# Altium footprint library con-samtec.PCBLIB: 805 footprints (part 27 of 55)
Each footprint in its own frame and in the unit in brackets; x right, y up, seen from the top. Pads: shape width x height; smd on the part's side, far side on the other; paste and mask are expansions set on the pad; w line width, h text height; cw(c..) or ccw(c..) is an arc to the next point about the centre after c.
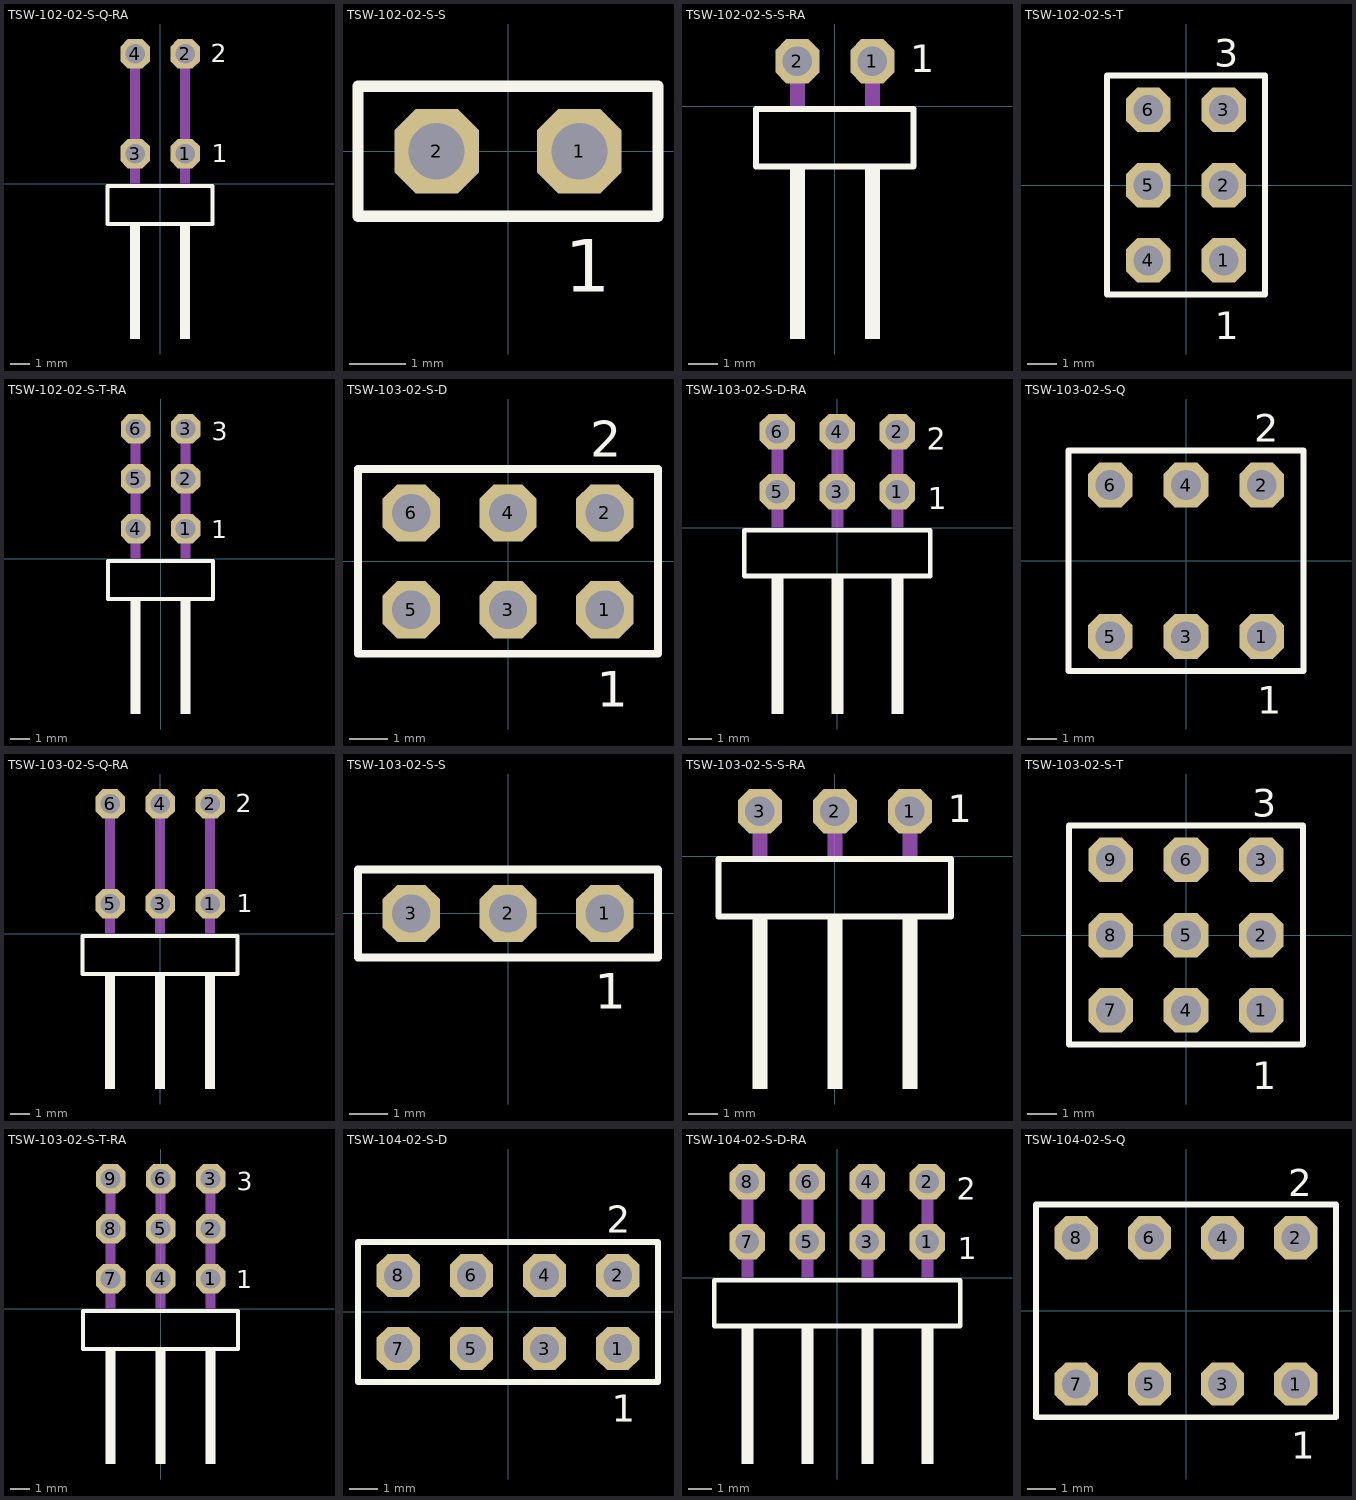
[diagram p26: the footprints below, top view; thin cyan lines are the x and y axes]

## TSW-102-02-S-Q-RA [mil]
pads (4):
  oct 59.06x59.06 hole 39.37: 1(50,60) 2(50,260) 3(-50,60) 4(-50,260)
Top Overlay:
  rectangle: -60,-310.63 -40,-80.32
  rectangle: 40,-310.63 60,-80.32
  lines w8: -105.08,-80.55 105.08,-80.55 105.08,-4.17 -105.08,-4.17 -105.08,-80.55
  text "1" at 103.54,43.31 h36.81
  text "2" at 101.18,242.72 h36.81
Mechanical 16:
  rectangle: -60,0 -40,270
  rectangle: 40,0 60,270

## TSW-102-02-S-S [mm]
pads (2):
  oct 1.5x1.5 hole 1: 1(1.27,0) 2(-1.27,0)
Top Overlay:
  lines w0.203: -2.669,-1.155 2.669,-1.155 2.669,1.155 -2.669,1.155 -2.669,-1.155
  text "1" at 1.012,-2.498 h0.94
Mechanical 16:
  rectangle: -1.62,-0.35 -0.92,0.35
  rectangle: 0.92,-0.35 1.62,0.35

## TSW-102-02-S-S-RA [mil]
pads (2):
  oct 59.06x59.06 hole 39.37: 1(50,60) 2(-50,60)
Top Overlay:
  rectangle: -60,-310.63 -40,-80.32
  rectangle: 40,-310.63 60,-80.32
  lines w8: -105.08,-80.55 105.08,-80.55 105.08,-4.17 -105.08,-4.17 -105.08,-80.55
  text "1" at 100.47,45.35 h36.81
Mechanical 16:
  rectangle: -60,0 -40,70
  rectangle: 40,0 60,70

## TSW-102-02-S-T [mm]
pads (6):
  oct 1.5x1.5 hole 1: 1(1.27,-2.54) 2(1.27,0) 3(1.27,2.54) 4(-1.27,-2.54) 5(-1.27,0) 6(-1.27,2.54)
Top Overlay:
  lines w0.203: -2.669,-3.695 2.669,-3.695 2.669,3.695 -2.669,3.695 -2.669,-3.695
  text "1" at 0.962,-5.188 h0.94
  text "3" at 0.958,3.989 h0.94
Mechanical 16:
  rectangle: -1.62,-2.89 -0.92,-2.19
  rectangle: -1.62,-0.35 -0.92,0.35
  rectangle: -1.62,2.19 -0.92,2.89
  rectangle: 0.92,-2.89 1.62,-2.19
  rectangle: 0.92,-0.35 1.62,0.35
  rectangle: 0.92,2.19 1.62,2.89

## TSW-102-02-S-T-RA [mil]
pads (6):
  oct 59.06x59.06 hole 39.37: 1(50,60) 2(50,160) 3(50,260) 4(-50,60) 5(-50,160) 6(-50,260)
Top Overlay:
  rectangle: -60,-310.63 -40,-80.32
  rectangle: 40,-310.63 60,-80.32
  lines w8: -105.08,-80.55 105.08,-80.55 105.08,-4.17 -105.08,-4.17 -105.08,-80.55
  text "1" at 101.57,41.34 h36.81
  text "3" at 102.17,236.81 h36.81
Mechanical 16:
  rectangle: -60,0 -40,270
  rectangle: 40,0 60,270

## TSW-103-02-S-D [mm]
pads (6):
  oct 1.5x1.5 hole 1: 1(2.54,-1.27) 2(2.54,1.27) 3(0,-1.27) 4(0,1.27) 5(-2.54,-1.27) 6(-2.54,1.27)
Top Overlay:
  lines w0.203: -3.939,-2.425 3.939,-2.425 3.939,2.425 -3.939,2.425 -3.939,-2.425
  text "1" at 2.332,-3.818 h0.94
  text "2" at 2.157,2.744 h0.94
Mechanical 16:
  rectangle: -2.89,-1.62 -2.19,-0.92
  rectangle: -2.89,0.92 -2.19,1.62
  rectangle: -0.35,-1.62 0.35,-0.92
  rectangle: -0.35,0.92 0.35,1.62
  rectangle: 2.19,-1.62 2.89,-0.92
  rectangle: 2.19,0.92 2.89,1.62

## TSW-103-02-S-D-RA [mil]
pads (6):
  oct 59.06x59.06 hole 39.37: 1(100,60) 2(100,160) 3(0,60) 4(0,160) 5(-100,60) 6(-100,160)
Top Overlay:
  rectangle: -110,-310.63 -90,-80.32
  rectangle: -10,-310.63 10,-80.32
  rectangle: 90,-310.63 110,-80.32
  lines w8: -155.08,-80.55 155.08,-80.55 155.08,-4.17 -155.08,-4.17 -155.08,-80.55
  text "1" at 150.59,30.51 h36.81
  text "2" at 149.21,129.53 h36.81
Mechanical 16:
  rectangle: -110,0 -90,170
  rectangle: -10,0 10,170
  rectangle: 90,0 110,170

## TSW-103-02-S-Q [mm]
pads (6):
  oct 1.5x1.5 hole 1: 1(2.54,-2.54) 2(2.54,2.54) 3(0,-2.54) 4(0,2.54) 5(-2.54,-2.54) 6(-2.54,2.54)
Top Overlay:
  lines w0.203: -3.939,-3.695 3.939,-3.695 3.939,3.695 -3.939,3.695 -3.939,-3.695
  text "1" at 2.382,-5.138 h0.94
  text "2" at 2.282,3.989 h0.94
Mechanical 16:
  rectangle: -2.89,-2.89 -2.19,-2.19
  rectangle: -2.89,2.19 -2.19,2.89
  rectangle: -0.35,-2.89 0.35,-2.19
  rectangle: -0.35,2.19 0.35,2.89
  rectangle: 2.19,-2.89 2.89,-2.19
  rectangle: 2.19,2.19 2.89,2.89

## TSW-103-02-S-Q-RA [mil]
pads (6):
  oct 59.06x59.06 hole 39.37: 1(100,60) 2(100,260) 3(0,60) 4(0,260) 5(-100,60) 6(-100,260)
Top Overlay:
  rectangle: -110,-310.63 -90,-80.32
  rectangle: -10,-310.63 10,-80.32
  rectangle: 90,-310.63 110,-80.32
  lines w8: -155.08,-80.55 155.08,-80.55 155.08,-4.17 -155.08,-4.17 -155.08,-80.55
  text "1" at 153.54,43.31 h36.81
  text "2" at 151.18,242.72 h36.81
Mechanical 16:
  rectangle: -110,0 -90,270
  rectangle: -10,0 10,270
  rectangle: 90,0 110,270

## TSW-103-02-S-S [mm]
pads (3):
  oct 1.5x1.5 hole 1: 1(2.54,0) 2(0,0) 3(-2.54,0)
Top Overlay:
  lines w0.203: -3.939,-1.155 3.939,-1.155 3.939,1.155 -3.939,1.155 -3.939,-1.155
  text "1" at 2.282,-2.498 h0.94
Mechanical 16:
  rectangle: -2.89,-0.35 -2.19,0.35
  rectangle: -0.35,-0.35 0.35,0.35
  rectangle: 2.19,-0.35 2.89,0.35

## TSW-103-02-S-S-RA [mil]
pads (3):
  oct 59.06x59.06 hole 39.37: 1(100,60) 2(0,60) 3(-100,60)
Top Overlay:
  rectangle: -110,-310.63 -90,-80.32
  rectangle: -10,-310.63 10,-80.32
  rectangle: 90,-310.63 110,-80.32
  lines w8: -155.08,-80.55 155.08,-80.55 155.08,-4.17 -155.08,-4.17 -155.08,-80.55
  text "1" at 150.47,45.35 h36.81
Mechanical 16:
  rectangle: -110,0 -90,70
  rectangle: -10,0 10,70
  rectangle: 90,0 110,70

## TSW-103-02-S-T [mm]
pads (9):
  oct 1.5x1.5 hole 1: 1(2.54,-2.54) 2(2.54,0) 3(2.54,2.54) 4(0,-2.54) 5(0,0) 6(0,2.54) 7(-2.54,-2.54) 8(-2.54,0) 9(-2.54,2.54)
Top Overlay:
  lines w0.203: -3.939,-3.695 3.939,-3.695 3.939,3.695 -3.939,3.695 -3.939,-3.695
  text "1" at 2.232,-5.188 h0.94
  text "3" at 2.228,3.989 h0.94
Mechanical 16:
  rectangle: -2.89,-2.89 -2.19,-2.19
  rectangle: -2.89,-0.35 -2.19,0.35
  rectangle: -2.89,2.19 -2.19,2.89
  rectangle: -0.35,-2.89 0.35,-2.19
  rectangle: -0.35,-0.35 0.35,0.35
  rectangle: -0.35,2.19 0.35,2.89
  rectangle: 2.19,-2.89 2.89,-2.19
  rectangle: 2.19,-0.35 2.89,0.35
  rectangle: 2.19,2.19 2.89,2.89

## TSW-103-02-S-T-RA [mil]
pads (9):
  oct 59.06x59.06 hole 39.37: 1(100,60) 2(100,160) 3(100,260) 4(0,60) 5(0,160) 6(0,260) 7(-100,60) 8(-100,160) 9(-100,260)
Top Overlay:
  rectangle: -110,-310.63 -90,-80.32
  rectangle: -10,-310.63 10,-80.32
  rectangle: 90,-310.63 110,-80.32
  lines w8: -155.08,-80.55 155.08,-80.55 155.08,-4.17 -155.08,-4.17 -155.08,-80.55
  text "1" at 151.57,41.34 h36.81
  text "3" at 152.17,236.81 h36.81
Mechanical 16:
  rectangle: -110,0 -90,270
  rectangle: -10,0 10,270
  rectangle: 90,0 110,270

## TSW-104-02-S-D [mm]
pads (8):
  oct 1.5x1.5 hole 1: 1(3.81,-1.27) 2(3.81,1.27) 3(1.27,-1.27) 4(1.27,1.27) 5(-1.27,-1.27) 6(-1.27,1.27) 7(-3.81,-1.27) 8(-3.81,1.27)
Top Overlay:
  lines w0.203: -5.209,-2.425 5.209,-2.425 5.209,2.425 -5.209,2.425 -5.209,-2.425
  text "1" at 3.602,-3.818 h0.94
  text "2" at 3.427,2.744 h0.94
Mechanical 16:
  rectangle: -4.16,-1.62 -3.46,-0.92
  rectangle: -4.16,0.92 -3.46,1.62
  rectangle: -1.62,-1.62 -0.92,-0.92
  rectangle: -1.62,0.92 -0.92,1.62
  rectangle: 0.92,-1.62 1.62,-0.92
  rectangle: 0.92,0.92 1.62,1.62
  rectangle: 3.46,-1.62 4.16,-0.92
  rectangle: 3.46,0.92 4.16,1.62

## TSW-104-02-S-D-RA [mil]
pads (8):
  oct 59.06x59.06 hole 39.37: 1(150,60) 2(150,160) 3(50,60) 4(50,160) 5(-50,60) 6(-50,160) 7(-150,60) 8(-150,160)
Top Overlay:
  rectangle: -160,-310.63 -140,-80.32
  rectangle: -60,-310.63 -40,-80.32
  rectangle: 40,-310.63 60,-80.32
  rectangle: 140,-310.63 160,-80.32
  lines w8: -205.08,-80.55 205.08,-80.55 205.08,-4.17 -205.08,-4.17 -205.08,-80.55
  text "1" at 200.59,30.51 h36.81
  text "2" at 199.21,129.53 h36.81
Mechanical 16:
  rectangle: -160,0 -140,170
  rectangle: -60,0 -40,170
  rectangle: 40,0 60,170
  rectangle: 140,0 160,170

## TSW-104-02-S-Q [mm]
pads (8):
  oct 1.5x1.5 hole 1: 1(3.81,-2.54) 2(3.81,2.54) 3(1.27,-2.54) 4(1.27,2.54) 5(-1.27,-2.54) 6(-1.27,2.54) 7(-3.81,-2.54) 8(-3.81,2.54)
Top Overlay:
  lines w0.203: -5.209,-3.695 5.209,-3.695 5.209,3.695 -5.209,3.695 -5.209,-3.695
  text "1" at 3.652,-5.138 h0.94
  text "2" at 3.552,3.989 h0.94
Mechanical 16:
  rectangle: -4.16,-2.89 -3.46,-2.19
  rectangle: -4.16,2.19 -3.46,2.89
  rectangle: -1.62,-2.89 -0.92,-2.19
  rectangle: -1.62,2.19 -0.92,2.89
  rectangle: 0.92,-2.89 1.62,-2.19
  rectangle: 0.92,2.19 1.62,2.89
  rectangle: 3.46,-2.89 4.16,-2.19
  rectangle: 3.46,2.19 4.16,2.89